# Altium integrated library Audio_Research.IntLib: 75 symbols (continued)
## ERJ-3EKF4991V (continued)
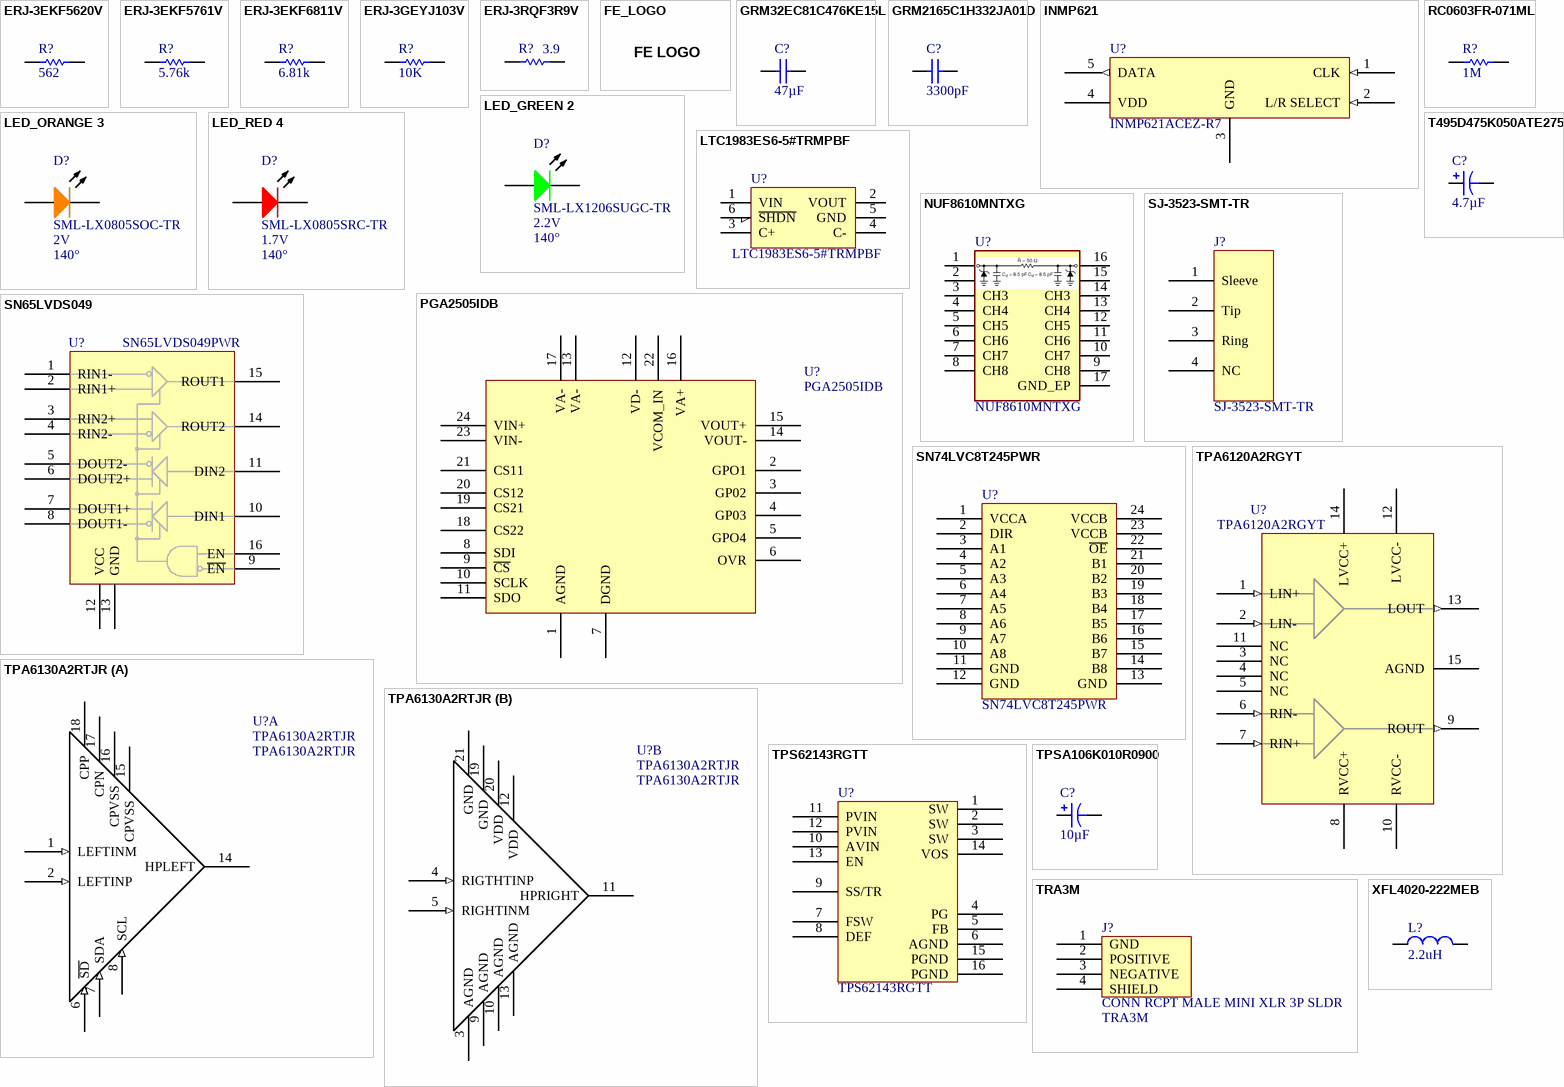
[diagram p2: symbols ERJ-3EKF5620V to XFL4020-222MEB]

## ERJ-3EKF5620V
designator R?  Resistance (Ohms): 562  (hidden comment: ERJ-3EKF5620V)
RES SMD 562 OHM 1% 1/10W 0603; Manufacturer: Panasonic Electronic Components; Power (Watts): 0.1W, 1/10W; Temperature Coefficient: ±100ppm/°C; Supplier 1: Digi-Key; Manufacturer Part Number: ERJ-3EKF5620V; RoHS: RoHS Compliant; Category: Resistors; Stock 1: 336376; Pricing 1: 1=0.1, 50=0.0114, 100=0.0084, 250=0.00644, 500=0.00514, 1000=0.00379 (USD); Packaging: Cut Tape (CT); Part Status: Active; Tolerance: ±1%; Composition: Thick Film; Features: Automotive AEC-Q200; Operating Temperature: -55°C ~ 155°C; Package / Case: 0603 (1608 Metric); Supplier Device Package: 0603; Size / Dimension: 0.063" L x 0.031" W (1.60mm x 0.80mm); Height: 0.022" (0.55mm); Number of Terminations: 2; Failure Rate: -; ComponentLink1URL: http://industrial.panasonic.com/www-cgi/jvcr13pz.cgi?E+PZ+3+AOA0002+ERJ3EKF5620V+7+WW; ComponentLink1Description: http://industrial.panasonic.com/www-cgi/jvcr13pz.cgi?E+PZ+3+AOA0002+ERJ3EKF5620V+7+WW; Supplier Part Number 1: P562HCT-ND
footprint 3-0603_R_L (Chip Resistor, Body 1.6x0.8mm, IPC High Density)
pins: 1, 2

## ERJ-3EKF5761V
designator R?  Resistance (Ohms): 5.76k  (hidden comment: ERJ-3EKF5761V)
RES SMD 5.76K OHM 1% 1/10W 0603; Manufacturer: Panasonic Electronic Components; Power (Watts): 0.1W, 1/10W; Temperature Coefficient: ±100ppm/°C; Supplier 1: Digi-Key; Manufacturer Part Number: ERJ-3EKF5761V; RoHS: RoHS Compliant; Category: Resistors; Stock 1: 90842; Pricing 1: 1=0.1, 50=0.0114, 100=0.0084, 250=0.00644, 500=0.00514, 1000=0.00379 (USD); Packaging: Cut Tape (CT); Part Status: Active; Tolerance: ±1%; Composition: Thick Film; Features: Automotive AEC-Q200; Operating Temperature: -55°C ~ 155°C; Package / Case: 0603 (1608 Metric); Supplier Device Package: 0603; Size / Dimension: 0.063" L x 0.031" W (1.60mm x 0.80mm); Height: 0.022" (0.55mm); Number of Terminations: 2; ComponentLink1URL: http://industrial.panasonic.com/www-cgi/jvcr13pz.cgi?E+PZ+3+AOA0002+ERJ3EKF5761V+7+WW; ComponentLink1Description: http://industrial.panasonic.com/www-cgi/jvcr13pz.cgi?E+PZ+3+AOA0002+ERJ3EKF5761V+7+WW; Supplier Part Number 1: P5.76KHCT-ND; Load Status: *
footprint 3-0603_R_L (Chip Resistor, Body 1.6x0.8mm, IPC High Density)
pins: 1, 2

## ERJ-3EKF6811V
designator R?  Resistance: 6.81k  (hidden comment: ERJ-3EKF6811V)
RES SMD 6.81K OHM 1% 1/10W 0603; Manufacturer: Panasonic ECG; Voltage Rating: 75V; Power Rating: 100mW; Temperature Coefficient: 100ppm/°C; Voltage Rating (DC): 50V; Stock 1: 326226; Pricing 1: 1=0.1, 10=0.063, 100=0.0257, 1000=0.0115, 2500=0.01 (USD); Mount: Surface Mount; Case/Package: 0603; Case Code (Imperial): 0603; Case Code (Metric): 1608; Contact Plating: Tin; Min Operating Temperature: -55°C; Max Operating Temperature: 155°C; Tolerance: 1%; Packaging: Tape and Reel; Package Quantity: 1; Composition: Thick Film; Number of Terminations: 2; Termination: SMD/SMT; Military Standard: Not; Max Power Dissipation: 100mW; Length: 1.6mm; Height: 0.45mm; Width: 0.8mm; Depth: 0.8mm; Radiation Hardening: No; REACH SVHC: Unknown; Lead Free: Lead Free; ComponentLink1URL: https://datasheet.ciiva.com/9117/aoa0000ce2-9117125.pdf; ComponentLink1Description: https://datasheet.ciiva.com/9117/aoa0000ce2-9117125.pdf; ComponentLink2URL: https://datasheet.ciiva.com/46389/426256-46389990.pdf; ComponentLink2Description: https://datasheet.ciiva.com/46389/426256-46389990.pdf; ComponentLink3URL: https://datasheet.ciiva.com/24027/aoa0000ce2-24027336.pdf; ComponentLink3Description: https://datasheet.ciiva.com/24027/aoa0000ce2-24027336.pdf; ComponentLink4URL: https://datasheet.ciiva.com/28693/1678782-28693560.pdf; ComponentLink4Description: https://datasheet.ciiva.com/28693/1678782-28693560.pdf; ComponentLink5URL: https://datasheet.ciiva.com/5969/426256-5969386.pdf; ComponentLink5Description: https://datasheet.ciiva.com/5969/426256-5969386.pdf; ComponentLink6URL: https://datasheet.ciiva.com/16440/aoa0000ce2-16440170.pdf; ComponentLink6Description: https://datasheet.ciiva.com/16440/aoa0000ce2-16440170.pdf; ComponentLink7URL: https://datasheet.ciiva.com/48531/aoa0000ce2-48531934.pdf; ComponentLink7Description: https://datasheet.ciiva.com/48531/aoa0000ce2-48531934.pdf; ComponentLink8URL: https://datasheet.ciiva.com/16759/70260748-16759487.pdf; ComponentLink8Description: https://datasheet.ciiva.com/16759/70260748-16759487.pdf; ComponentLink9URL: https://datasheet.ciiva.com/43460/426256-43460527.pdf; ComponentLink9Description: https://datasheet.ciiva.com/43460/426256-43460527.pdf; Supplier Part Number 1: P6.81KHDKR-ND; Supplier 1: Digi-Key; Manufacturer Part Number: ERJ-3EKF6811V
footprint 3-0603_R_L (Chip Resistor, Body 1.6x0.8mm, IPC High Density)
pins: 1, 2

## ERJ-3GEYJ103V
designator R?  Resistance (Ohms): 10K  (hidden comment: ERJ-3GEYJ103V)
RES 10K OHM 1/10W 5% 0603 SMD; Manufacturer: Panasonic - ECG; Power (Watts): 0.1W, 1/10W; Temperature Coefficient: ±200ppm/°C; Supplier 1: Digi-Key; Manufacturer Part Number: ERJ-3GEYJ103V; RoHS: RoHS Compliant; Category: Resistors; Stock 1: 16219504; Pricing 1: 1=0.02, 50=0.0092, 100=0.007, 250=0.0052, 500=0.00384, 1000=0.00256 (USD); Composition: Thick Film; Features: -; Tolerance: ±5%; Package / Case: 0603 (1608 Metric); Size / Dimension: 0.063" L x 0.031" W (1.60mm x 0.80mm); Height: 0.022" (0.55mm); Number of Terminations: 2; Packaging: Cut Tape (CT); ComponentLink1URL: http://industrial.panasonic.com/www-cgi/jvcr13pz.cgi?E+PZ+3+AOA0001+ERJ3GEYJ103V+7+WW; ComponentLink1Description: http://industrial.panasonic.com/www-cgi/jvcr13pz.cgi?E+PZ+3+AOA0001+ERJ3GEYJ103V+7+WW; Supplier Part Number 1: P10KGCT-ND
footprint 3-0603_R_L (Chip Resistor, Body 1.6x0.8mm, IPC High Density)
pins: 1, 2

## ERJ-3RQF3R9V
designator R?  Resistance (Ohms): 3.9  (hidden comment: ERJ-3RQF3R9V)
RES 3.9 OHM 1/10W 1% 0603 SMD; Manufacturer: Panasonic Electronic Components; Power (Watts): 0.1W, 1/10W; Temperature Coefficient: ±200ppm/°C; Supplier 1: Digi-Key; Manufacturer Part Number: ERJ-3RQF3R9V; RoHS: RoHS Compliant; Category: Resistors; Stock 1: 44573; Pricing 1: 1=0.29, 50=0.1138, 100=0.0878, 250=0.06824, 500=0.0481, 1000=0.0351 (USD); Packaging: Cut Tape (CT); Tolerance: ±1%; Composition: Thick Film; Features: -; Package / Case: 0603 (1608 Metric); Supplier Device Package: 0603; Size / Dimension: 0.063" L x 0.031" W (1.60mm x 0.80mm); Height: 0.022" (0.55mm); Number of Terminations: 2; ComponentLink1URL: http://industrial.panasonic.com/www-cgi/jvcr13pz.cgi?E+PZ+3+AOA0003+ERJ3RQF3R9V+7+WW; ComponentLink1Description: http://industrial.panasonic.com/www-cgi/jvcr13pz.cgi?E+PZ+3+AOA0003+ERJ3RQF3R9V+7+WW; Supplier Part Number 1: P3.9AJCT-ND
footprint 3-0603_R_L (Chip Resistor, Body 1.6x0.8mm, IPC High Density)
pins: 1, 2

## FE_LOGO
designator Logo?  (value not drawn)  (no BOM)
FE LOGO in Copper; Load Status: Do Not Install
footprint feLogo_small (FlatEarth small logo in copper)
footprint feLogo_medium (FlatEarth medium logo in copper)
text: FE LOGO

## GRM32EC81C476KE15L
designator C?  Capacitance: 47µF  (hidden comment: GRM32EC81C476KE15L)
47µF ±10% 16V Ceramic Capacitor X6S 1210 (3225 Metric); Manufacturer: Murata Electronics North America; Supplier 1: Digi-Key; Manufacturer Part Number: GRM32EC81C476KE15L; RoHS: RoHS Compliant; Category: Capacitors; Stock 1: 39641; Pricing 1: 1=0.73, 10=0.697, 25=0.4944, 50=0.4164, 100=0.3383, 250=0.28108, 500=0.25504 (USD); Packaging: Cut Tape (CT); Tolerance: ±10%; Voltage - Rated: 16V; Temperature Coefficient: X6S; Mounting Type: Surface Mount, MLCC; Operating Temperature: -55°C ~ 105°C; Applications: General Purpose; Ratings: -; Package / Case: 1210 (3225 Metric); Size / Dimension: 0.126" L x 0.098" W (3.20mm x 2.50mm); Height - Seated (Max): -; Thickness (Max): 0.106" (2.70mm); Lead Spacing: -; Features: Derating Recommended; Lead Style: -; ComponentLink1URL: http://www.murata.com/~/media/webrenewal/support/library/catalog/products/capacitor/mlcc/c02e.pdf; ComponentLink1Description: http://www.murata.com/~/media/webrenewal/support/library/catalog/products/capacitor/mlcc/c02e.pdf; Supplier Part Number 1: 490-10531-1-ND; Part Status: Active; Failure Rate: *
footprint C1210X25_L (Chip Capacitor, Body 3.2x2.5mm, IPC High Density)
pins: 1, 2

## GRM2165C1H332JA01D
designator C?  Capacitance: 3300pF  (hidden comment: GRM2165C1H332JA01D)
CAP CER 3300PF 50V NP0 0805; Manufacturer: Murata Electronics North America; Tolerance: ±5%; Temperature Coefficient: C0G, NP0; Supplier 1: Digi-Key; Manufacturer Part Number: GRM2165C1H332JA01D; RoHS: RoHS Compliant; Category: Capacitors; Stock 1: 67484; Pricing 1: 1=0.17, 10=0.12, 50=0.069, 100=0.057, 250=0.048, 500=0.0402, 1000=0.033 (USD); Packaging: Cut Tape (CT); Part Status: Active; Voltage - Rated: 50V; Operating Temperature: -55°C ~ 125°C; Ratings: -; Applications: General Purpose; Mounting Type: Surface Mount, MLCC; Package / Case: 0805 (2012 Metric); Size / Dimension: 0.079" L x 0.049" W (2.00mm x 1.25mm); Thickness (Max): 0.028" (0.70mm); ComponentLink1URL: http://www.murata.com/~/media/webrenewal/support/library/catalog/products/capacitor/mlcc/c02e.pdf; ComponentLink1Description: http://www.murata.com/~/media/webrenewal/support/library/catalog/products/capacitor/mlcc/c02e.pdf; Supplier Part Number 1: 490-1632-1-ND
footprint 6-0805_L (Chip Capacitor, Body 2.0x1.2mm, IPC High Density)
pins: 1, 2

## INMP621
designator U?  Manufacturer Part Number: INMP621ACEZ-R7  (hidden comment: INMP621)
45Hz ~ 20kHz Digital, PDM Microphone MEMS (Silicon) Omnidirectional (-46dB ±2dB @ 94dB SPL) Solder Pads; Manufacturer: InvenSense; S/N Ratio: 65dB; Voltage Range: 1.62 ~ 3.63V; Current - Supply: 1.6mA; Port Location: Bottom; Seal Rating: None; Shape: Rectangular; Supplier 1: Digi-Key; RoHS: RoHS Compliant; Category: Audio Products; Stock 1: 1211; Pricing 1: 1=2.88, 10=2.491, 25=2.2292, 50=1.9668, 100=1.9012, 250=1.83568, 500=1.77012 (USD); Packaging: Cut Tape (CT); Part Status: Active; Type: MEMS (Silicon); Output Type: Digital, PDM; Direction: Omnidirectional; Frequency Range: 45Hz ~ 20kHz; Sensitivity: -46dB ±2dB @ 94dB SPL; Impedance: -; Voltage - Rated: -; Termination: Solder Pads; Size / Dimension: 4.00mm L x 3.00mm W; Height (Max): 1.10mm; ComponentLink1URL: https://www.invensense.com/wp-content/uploads/2015/02/INMP621.pdf; ComponentLink1Description: https://www.invensense.com/wp-content/uploads/2015/02/INMP621.pdf; Supplier Part Number 1: 1428-1018-1-ND
footprint INMP621 (Wide Dynamic Range Microphone with PDM Digital Output)
pins: 1 CLK (in) "Clock Input to Microphone", 2 L/R SELECT (in) "Left Channel or Right Channel Select:  DATA 1 (right): L/R SELECT tied to GND  DATA 2 (left): L/R SELECT tied to VDD", 3 GND "Ground", 4 VDD "Power Supply. For best performance and to avoid potential parasitic artifacts, place a 0.1 µF (100 nF) ceramic type X7R capacitor between Pin 4 (VDD) and ground. Place the capacitor as close to Pin 4 as possible.", 5 DATA (out) "Digital Output Signal (DATA1 or DATA2)"

## LED_GREEN 2
designator D?  Manufacturer Part Number: SML-LX1206SUGC-TR  Voltage - Forward (Vf) Typ: 2.2V  Viewing Angle: 140°  (hidden comment: LED_GREEN 2)
LED ALINGAP ULT GRN CLR 1206 SMD; Manufacturer: Lumex Opto/Components Inc; Color: Green; Millicandela Rating: 45mcd; Current - Test: 20mA; Wavelength - Peak: 574nm; Lens Type: Clear; Lens Style/Size: Rectangle with Flat Top, 2mm x 1.6mm; Supplier 1: Digi-Key; RoHS: RoHS Compliant; Category: Optoelectronics; Stock 1: 11785; Pricing 1: 1=0.64, 10=0.49, 100=0.3534, 250=0.31352, 500=0.2679, 1000=0.2109 (USD); Wavelength - Dominant: -; Package / Case: 1206 (3216 Metric); Size / Dimension: 3.20mm L x 1.60mm W; Height: 1.10mm; Mounting Type: Surface Mount; Packaging: Cut Tape (CT); Luminous Flux @ Current - Test: -; ComponentLink1URL: http://www.lumex.com/specs/SML-LX1206SUGC-TR.pdf; ComponentLink1Description: http://www.lumex.com/specs/SML-LX1206SUGC-TR.pdf; Supplier Part Number 1: 67-1698-1-ND
footprint DIOCP3216X11L (Chip Diode, 2-Leads, Body 3.2x1.6mm, IPC High Density)
pins: 1 A, 2 K

## LED_ORANGE 3
designator D?  Manufacturer Part Number: SML-LX0805SOC-TR  Voltage - Forward (Vf) (Typ): 2V  Viewing Angle: 140°  (hidden comment: LED_ORANGE 3)
LED 610NM SUPER ORANGE 0805 SMD; Manufacturer: Lumex Opto/Components Inc; Millicandela Rating: 60mcd; Current - Test: 20mA; Lens Type: Clear; Lens Style/Size: Rectangle with Flat Top, 1.4mm x 1.25mm; Supplier 1: Digi-Key; RoHS: RoHS Compliant; Category: Optoelectronics; Stock 1: 13373; Pricing 1: 1=0.65, 10=0.502, 100=0.3255, 250=0.279, 500=0.2418, 1000=0.186 (USD); Packaging: Cut Tape (CT); Color: Orange; Wavelength - Dominant: -; Wavelength - Peak: 610nm; Package / Case: 0805 (2012 Metric); Size / Dimension: 2.00mm L x 1.25mm W; Height: 1.10mm; Mounting Type: Surface Mount; Luminous Flux @ Current - Test: -; ComponentLink1URL: http://www.lumex.com/specs/SML-LX0805SOC-TR.pdf; ComponentLink1Description: http://www.lumex.com/specs/SML-LX0805SOC-TR.pdf; Supplier Part Number 1: 67-1637-1-ND
footprint DIOM2012X12L_ORANGE (Molded Diode, 2-Leads, Body 2.0x1.3mm, IPC High Density)
pins: 1 A, 2 K

## LED_RED 4
designator D?  Manufacturer Part Number: SML-LX0805SRC-TR  Voltage - Forward (Vf) (Typ): 1.7V  Viewing Angle: 140°  (hidden comment: LED_RED 4)
LED 660NM SUPER RED CLR 0805 T/R; Manufacturer: Lumex Opto/Components Inc; Millicandela Rating: 25mcd; Current - Test: 20mA; Lens Type: Clear; Supplier 1: Digi-Key; RoHS: RoHS Compliant; Category: Optoelectronics; Stock 1: 1141; Pricing 1: 1=0.56, 10=0.395, 100=0.2596, 250=0.19472, 500=0.177, 1000=0.1416 (USD); Packaging: Cut Tape (CT); Color: Red; Wavelength - Dominant: -; Wavelength - Peak: 660nm; Lens Style/Size: *; Package / Case: 0805 (2012 Metric); Size / Dimension: 2.00mm L x 1.25mm W; Height: 1.10mm; Mounting Type: Surface Mount; Luminous Flux @ Current - Test: -; ComponentLink1URL: http://www.lumex.com/specs/SML-LX0805SRC-TR.pdf; ComponentLink1Description: http://www.lumex.com/specs/SML-LX0805SRC-TR.pdf; Supplier Part Number 1: 67-2191-1-ND
footprint DIOM2012X12L_RED (Molded Diode, 2-Leads, Body 2.0x1.3mm, IPC High Density)
pins: 1 A, 2 K

## LTC1983ES6-5#TRMPBF
designator U?  Manufacturer Part Number: LTC1983ES6-5#TRMPBF
IC REG SWITCHD CAP INV -5V SOT23; Manufacturer: Linear Technology; Output Type: Fixed; Number of Outputs: 1; Voltage - Input: 2.3 V ~ 5.5 V; PWM Type: Burst Mode®; Frequency - Switching: 900kHz; Current - Output: 100mA; Synchronous Rectifier: No; Supplier 1: Digi-Key; RoHS: RoHS Compliant; Category: Integrated Circuits (ICs); Stock 1: 6466; Pricing 1: 1=4.28, 25=3.8192, 100=3.4371 (USD); Packaging: Cut Tape (CT); Type: Switched Capacitor (Charge Pump), Inverting; Voltage - Output: -5V; Operating Temperature: -40°C ~ 85°C; Mounting Type: Surface Mount; Package / Case: SOT-23-6 Thin, TSOT-23-6; Supplier Device Package: TSOT-23-6; ComponentLink1URL: http://www.linear.com/docs/2135; ComponentLink1Description: http://www.linear.com/docs/2135; Supplier Part Number 1: LTC1983ES6-5#TRMPBFCT-ND
footprint SOT23-6_L (SOT23, 6-Leads, Body 2.9x1.6mm, Pitch 0.95mm, Lead Span 2.7mm, IPC High Density)
pins: 1 VIN (power), 2 VOUT (power), 3 C+, 4 C-, 5 GND, 6 ~{SHDN}

## NUF8610MNTXG
designator U?
IC EMI FILTER 8CH 16-DFN; Manufacturer: ON Semiconductor; Number of Channels: 8; Attenuation Value: 15dB; ESD Protection: Yes; Capacitance: 8.5pF; Operating Supply Voltage: 5V; Number of Elements: 16; DC Resistance (DCR): 58R; Supplier 1: Digi-Key; Stock 1: 3186; Pricing 1: 1=0.47, 10=0.441, 25=0.4204, 50=0.4068, 100=0.3933, 250=0.373, 500=0.31194, 1000=0.2421 (USD); Packaging: Tape and Reel; Height: 0.039inch; ComponentLink1URL: https://datasheet.ciiva.com/1022/nuf8610-d-1022805.pdf; ComponentLink1Description: https://datasheet.ciiva.com/1022/nuf8610-d-1022805.pdf; Supplier Part Number 1: NUF8610MNTXGOSCT-ND; Manufacturer Part Number: NUF8610MNTXG; Case/Package: DFN; Number of Pins: 16; Contact Plating: Tin,Matte; Min Operating Temperature: -40°C; Max Operating Temperature: 85°C; Package Quantity: 4000; Termination: Flat; Length: 4mm; Width: 0.063inch; Depth: 1.6mm; Radiation Hardening: No; REACH SVHC: No SVHC; Lead Free: Lead Free; ComponentLink2URL: https://datasheet.ciiva.com/1022/nuf8610-d-1022806.pdf; ComponentLink2Description: https://datasheet.ciiva.com/1022/nuf8610-d-1022806.pdf; ComponentLink3URL: https://datasheet.ciiva.com/1022/nuf8610-d-1022807.pdf; ComponentLink3Description: https://datasheet.ciiva.com/1022/nuf8610-d-1022807.pdf; ComponentLink4URL: https://datasheet.ciiva.com/26019/nuf8610-d-26019159.pdf; ComponentLink4Description: https://datasheet.ciiva.com/26019/nuf8610-d-26019159.pdf; ComponentLink5URL: https://datasheet.ciiva.com/12395/nuf8610-d-116660-12395000.pdf; ComponentLink5Description: https://datasheet.ciiva.com/12395/nuf8610-d-116660-12395000.pdf; Voltage Rating (DC): 5V; Circuit Type: Filter; Number of Lines: 8; Halogen Free: Halogen Free
footprint ONSC-DFN-16-506AC_V (SON, 16-Leads, Body 4x1.6mm, Pitch 0.5mm, Thermal Pad 4.1x0.5mm)
pins: 1 CH1, 2 CH2, 3 CH3, 4 CH4, 5 CH5, 6 CH6, 7 CH7, 8 CH8, 9 CH8, 10 CH7, 11 CH6, 12 CH5, 13 CH4, 14 CH3, 15 CH2, 16 CH1, 17 GND_EP (power)

## PGA2505IDB
designator U?, comment Manufacturer Part Number: PGA2505IDB  (hidden comment: Microphone Preamp)
IC DGTL CTRLR MICOPHN AMP 24SSOP; Manufacturer: Texas Instruments; Number of Channels: 1; Max Supply Voltage: 5.25V; Min Supply Voltage: 4.75V; Operating Supply Current: 30mA; Input Offset Voltage (Vos): 1mV; Gain: 60dB; Interface: SPI; Dual Supply Voltage: 5V; Input Voltage Noise Density: 3nV/sqrt Hz; Min Dual Supply Voltage: -4.75V; Load Impedance: 600R; Supplier 1: Digi-Key; Stock 1: 358; Pricing 1: 1=10.98, 10=10.088, 100=8.52, 500=7.5792, 1000=6.9519 (USD); Case/Package: SSOP; Number of Pins: 24; Weight: 0.007764oz; Min Operating Temperature: -40°C; Max Operating Temperature: 85°C; Packaging: Rail/Tube; Package Quantity: 60; Max Input Voltage: 5.25V; Quiescent Current: 30mA; Max Dual Supply Voltage: 5.25V; Operating Supply Voltage: 5V; Length: 8.2mm; Height: 1.95mm; Width: 5.3mm; Radiation Hardening: No; REACH SVHC: No SVHC; Lead Free: Lead Free; ComponentLink1URL: https://datasheet.ciiva.com/1789/pga2505-1789587.pdf; ComponentLink1Description: https://datasheet.ciiva.com/1789/pga2505-1789587.pdf; ComponentLink2URL: https://datasheet.ciiva.com/2968/pga2505-2968036.pdf; ComponentLink2Description: https://datasheet.ciiva.com/2968/pga2505-2968036.pdf; ComponentLink3URL: https://datasheet.ciiva.com/15131/getdatasheetpartid-220694-15131828.pdf; ComponentLink3Description: https://datasheet.ciiva.com/15131/getdatasheetpartid-220694-15131828.pdf; ComponentLink4URL: https://datasheet.ciiva.com/26118/sbos396b-26118602.pdf; ComponentLink4Description: https://datasheet.ciiva.com/26118/sbos396b-26118602.pdf; ComponentLink5URL: https://datasheet.ciiva.com/1481/1772560-1481451.pdf; ComponentLink5Description: https://datasheet.ciiva.com/1481/1772560-1481451.pdf; ComponentLink6URL: https://datasheet.ciiva.com/26842/pga2505idb-26842003.pdf; ComponentLink6Description: https://datasheet.ciiva.com/26842/pga2505idb-26842003.pdf; Supplier Part Number 1: 296-24572-5-ND
footprint SOP65P780X200-28N (SOP, 28-Leads, Body 10.20x5.30mm, Pitch 0.65mm, IPC Medium Density)
pins: 1 AGND, 2 GPO1, 3 GP02, 4 GP03, 5 GPO4, 6 OVR, 7 DGND, 8 SDI, 9 ~{CS}, 10 SCLK, 11 SDO, 12 VD-, 13 VA-, 14 VOUT-, 15 VOUT+, 16 VA+, 17 VA-, 18 CS22, 19 CS21, 20 CS12, 21 CS11, 22 VCOM_IN, 23 VIN-, 24 VIN+

## RC0603FR-071ML
designator R?  Resistance: 1M  (hidden comment: RC0603FR-071ML)
RES SMD 1M OHM 1% 1/10W 0603; Manufacturer: Yageo; Voltage Rating: 50V; Power Rating: 100mW; Temperature Coefficient: 100ppm/°C; Supplier 1: Digi-Key; Manufacturer Part Number: RC0603FR-071ML; Stock 1: 1662972; Pricing 1: 1=0.1, 10=0.015, 100=0.006, 1000=0.0027, 2500=0.0023 (USD); Case/Package: 0603; Number of Pins: 2; Case Code (Imperial): 0603; Case Code (Metric): 1608; Min Operating Temperature: -55°C; Max Operating Temperature: 155°C; Voltage Rating (DC): 50V; Tolerance: 1%; Packaging: Tape and Reel; Package Quantity: 5000; Termination: SMD/SMT; Composition: Thick Film; Military Standard: Not; Length: 1.6mm; Height: 0.45mm; Width: 0.8mm; Depth: 0.8mm; REACH SVHC: No SVHC; Lead Free: Lead Free; ComponentLink1URL: https://datasheet.ciiva.com/12555/rc0603-272842-12555388.pdf; ComponentLink1Description: https://datasheet.ciiva.com/12555/rc0603-272842-12555388.pdf; ComponentLink2URL: https://datasheet.ciiva.com/7983/443971-7983614.pdf; ComponentLink2Description: https://datasheet.ciiva.com/7983/443971-7983614.pdf; ComponentLink3URL: https://datasheet.ciiva.com/11819/0900766b80f96399-11819295.pdf; ComponentLink3Description: https://datasheet.ciiva.com/11819/0900766b80f96399-11819295.pdf; Supplier Part Number 1: 311-1.00MHRDKR-ND
footprint 3-0603_R_L (Chip Resistor, Body 1.6x0.8mm, IPC High Density)
pins: 1, 2

## SJ-3523-SMT-TR
designator J?
3.50mm (0.141", 1/8", Mini Plug) - Headphone Phone Jack Stereo Connector Solder; Manufacturer: CUI Inc.; Gender: Female; Actual Diameter: 0.142" (3.60mm); Number of Positions/Contacts: 3 Conductors, 3 Contacts; Internal Switch(s): Does Not Contain Switch; Shielding: Unshielded; Voltage - Rated: 12VDC; Current Rating: 1A; Mating Length/Depth: 0.551" (14.00mm); Body Color: Black; Includes: 1 pc - 1 Connector; LatestRevisionDate: 17-Jul-2002; LatestRevisionNote: Re-released for DXP Platform.; Publisher: Altium Limited; Supplier 1: Digi-Key; RoHS: RoHS Compliant; Category: Connectors, Interconnects; Stock 1: 104981; Pricing 1: 1=1.34, 10=1.043, 100=0.7961, 500=0.63558 (USD); Packaging: Cut Tape (CT); Part Status: Active; Connector Type: Phone Jack; Signal Lines: Stereo; Industry Recognized Mating Diameter: 3.50mm (0.141", 1/8", Mini Plug) - Headphone; Mounting Type: Surface Mount, Right Angle; Termination: Solder; Features: Board Guide; Insulation Color: -; Contact Material - Plating: Silver; Body Material: -; ComponentLink1URL: http://www.cui.com/product/resource/digikeypdf/sj-352x-smt_series.pdf; ComponentLink1Description: http://www.cui.com/product/resource/digikeypdf/sj-352x-smt_series.pdf; Supplier Part Number 1: CP-3523SJCT-ND; Manufacturer Part Number: SJ-3523-SMT-TR
footprint SJ-3523-SMT-TR (Female 3.5mm audio jack)
pins: 1 Sleeve, 2 Tip, 3 Ring, 4 NC

## SN65LVDS049
designator U?, comment Manufacturer Part Number: SN65LVDS049PWR  (hidden comment: IC LVDS DUAL DIF DVR/RCV 16TSSOP)
2/2 Transceiver Full LVDS 16-TSSOP; Manufacturer: Texas Instruments; Max Power Dissipation: 774mW; Nominal Supply Current: 35mA; Propagation Delay: 3.5ns; Max Supply Voltage: 3.6V; Min Supply Voltage: 3V; Number of Receivers: 2; Operating Supply Voltage: 3.3V; Data Rate: 400Mbps; Logic Function: Transceiver,Receiver; Max Input Current: 20uA; Max Output Voltage: 450mV; Supplier 1: Digi-Key; Stock 1: 4149; Pricing 1: 1=2.54, 10=2.282, 100=1.8341, 500=1.5069, 1000=1.2486 (USD); Case/Package: TSSOP; Number of Pins: 16; Weight: 0.002116oz; Contact Plating: Gold; Min Operating Temperature: -40°C; Max Operating Temperature: 85°C; Packaging: Tape and Reel; Package Quantity: 1; Number of Elements: 2; Number of Drivers: 2; Power Dissipation: 774mW; Turn-On Delay Time: 3.5ns; Radiation Hardening: No; REACH SVHC: No SVHC; Lead Free: Lead Free; ComponentLink1URL: https://datasheet.ciiva.com/1703/sn65lvds049-1703872.pdf; ComponentLink1Description: https://datasheet.ciiva.com/1703/sn65lvds049-1703872.pdf; ComponentLink2URL: https://datasheet.ciiva.com/1703/sn65lvds049-1703873.pdf; ComponentLink2Description: https://datasheet.ciiva.com/1703/sn65lvds049-1703873.pdf; ComponentLink3URL: https://datasheet.ciiva.com/15133/getdatasheetpartid-298932-15133393.pdf; ComponentLink3Description: https://datasheet.ciiva.com/15133/getdatasheetpartid-298932-15133393.pdf; ComponentLink4URL: https://datasheet.ciiva.com/3152/sn65lvds049-3152685.pdf; ComponentLink4Description: https://datasheet.ciiva.com/3152/sn65lvds049-3152685.pdf; ComponentLink5URL: https://datasheet.ciiva.com/26828/sn65lvds049pwr-26828740.pdf; ComponentLink5Description: https://datasheet.ciiva.com/26828/sn65lvds049pwr-26828740.pdf; Supplier Part Number 1: 296-26358-6-ND
footprint TSOP65P640X120-16N (TSOP, 16-Leads, Body 5.00x4.40mm, Pitch 0.65mm, IPC Medium Density)
pins: 1 RIN1-, 2 RIN1+, 3 RIN2+, 4 RIN2-, 5 DOUT2-, 6 DOUT2+, 7 DOUT1+, 8 DOUT1-, 9 ~{EN}, 10 DIN1, 11 DIN2, 12 VCC (power), 13 GND (power), 14 ROUT2, 15 ROUT1, 16 EN

## SN74LVC8T245PWR
designator U?, comment Manufacturer Part Number: SN74LVC8T245PWR  (hidden comment: IC BUS TRANSCVR 8BIT 24TSSOP)
Voltage Level Translator Bidirectional 1 Circuit 8 Channel 24-TSSOP; Manufacturer: Texas Instruments; Number of Channels: 8; Propagation Delay: 4.2ns; Number of Elements: 1; Min Supply Voltage: 1.65V; Max Supply Voltage: 5.5V; Operating Supply Voltage: 3.3V; Data Rate: 500Mbps; Logic Function: Transceiver,Translator; High Level Output Current: -32mA; Low Level Output Current: 32mA; Polarity: Non-Inverting; Turn-On Delay Time: 32.2ns; Quiescent Current: 15uA; ComponentLink1URL: https://datasheet.ciiva.com/1899/sn74lvc8t245-1899395.pdf; ComponentLink1Description: https://datasheet.ciiva.com/1899/sn74lvc8t245-1899395.pdf; ComponentLink2URL: https://datasheet.ciiva.com/34301/1048559-34301923.pdf; ComponentLink2Description: https://datasheet.ciiva.com/34301/1048559-34301923.pdf; ComponentLink3URL: https://datasheet.ciiva.com/1899/sn74lvc8t245-1899396.pdf; ComponentLink3Description: https://datasheet.ciiva.com/1899/sn74lvc8t245-1899396.pdf; ComponentLink4URL: https://datasheet.ciiva.com/1899/sn74lvc8t245-1899397.pdf; ComponentLink4Description: https://datasheet.ciiva.com/1899/sn74lvc8t245-1899397.pdf; ComponentLink5URL: https://datasheet.ciiva.com/7795/1763937-7795013.pdf; ComponentLink5Description: https://datasheet.ciiva.com/7795/1763937-7795013.pdf; ComponentLink6URL: https://datasheet.ciiva.com/15086/getdatasheetpartid-48801-15086005.pdf; ComponentLink6Description: https://datasheet.ciiva.com/15086/getdatasheetpartid-48801-15086005.pdf; ComponentLink7URL: https://datasheet.ciiva.com/25973/sn74lvc8t245-25973803.pdf; ComponentLink7Description: https://datasheet.ciiva.com/25973/sn74lvc8t245-25973803.pdf; ComponentLink8URL: https://datasheet.ciiva.com/46439/1831204-46439647.pdf; ComponentLink8Description: https://datasheet.ciiva.com/46439/1831204-46439647.pdf; ComponentLink9URL: https://datasheet.ciiva.com/26867/sn74lvc8t245pwr-26867745.pdf; ComponentLink9Description: https://datasheet.ciiva.com/26867/sn74lvc8t245pwr-26867745.pdf; ComponentLink10URL: https://datasheet.ciiva.com/41455/001017232-da-01-en-ic-bus-8bit-sn74lvc8t245pwr-tssop-24-tid-41455868.pdf; ComponentLink10Description: https://datasheet.ciiva.com/41455/001017232-da-01-en-ic-bus-8bit-sn74lvc8t245pwr-tssop-24-tid-41455868.pdf; Supplier 1: Digi-Key; Stock 1: 119243; Pricing 1: 1=1.05, 10=0.936, 100=0.7297, 500=0.6028, 1000=0.4759 (USD); Mount: Surface Mount; Case/Package: TSSOP; Number of Pins: 24; Weight: 0.003157oz; Contact Plating: Gold; Min Operating Temperature: -40°C; Max Operating Temperature: 85°C; Package Quantity: 1; Packaging: Tape and Reel; Direction: Bidirectional; Number of Bits: 8; Number of Outputs: 8; Length: 7.9mm; Height: 1.05mm; Width: 4.5mm; Radiation Hardening: No; REACH SVHC: No SVHC; Lead Free: Lead Free; Supplier Part Number 1: 296-18593-6-ND
footprint TSSOP40P640X120-24N (TSSOP, 24-Leads, Body 5.00x4.40mm, Pitch 0.40mm, IPC Medium Density)
pins: 1 VCCA (power), 2 DIR, 3 A1, 4 A2, 5 A3, 6 A4, 7 A5, 8 A6, 9 A7, 10 A8, 11 GND (power), 12 GND (power), 13 GND (power), 14 B8, 15 B7, 16 B6, 17 B5, 18 B4, 19 B3, 20 B2, 21 B1, 22 ~{OE}, 23 VCCB (power), 24 VCCB (power)

## T495D475K050ATE275
designator C?  Capacitance: 4.7µF  (hidden comment: T495D475K050ATE275)
CAP TANT 4.7UF 50V 10% 2917; Manufacturer: KEMET; Manufacturer Size Code: D; Type: Molded; ESR (Equivalent Series Resistance): 275 mOhm; Lifetime @ Temp.: 2000 Hrs @ 85°C; Supplier 1: Digi-Key; Manufacturer Part Number: T495D475K050ATE275; RoHS: RoHS Compliant; Category: Capacitors; Stock 1: 9255; Pricing 1: 1=2.05, 10=1.656, 25=1.5052, 50=1.445, 100=1.2644, 250=1.0838 (USD); Packaging: Cut Tape (CT); Part Status: Active; Tolerance: ±10%; Voltage - Rated: 50V; Operating Temperature: -55°C ~ 125°C; Mounting Type: Surface Mount; Package / Case: 2917 (7343 Metric); Size / Dimension: 0.287" L x 0.169" W (7.30mm x 4.30mm); Height - Seated (Max): 0.122" (3.10mm); Lead Spacing: -; Features: General Purpose; Failure Rate: -; ComponentLink1URL: http://www.kemet.com/docfinder?Partnumber=T495D475K050ATE275; ComponentLink1Description: http://www.kemet.com/docfinder?Partnumber=T495D475K050ATE275; Supplier Part Number 1: 399-4786-1-ND
footprint 2917-Tantalum-Cap
pins: 1 P, 2 N

## TPA6120A2RGYT
designator U?
Amplifier IC Headphones, 2-Channel (Stereo) Class AB 14-VQFN (3.5x3.5); Manufacturer: Texas Instruments; Max Output Power x Channels @ Load: 80mW x 2 @ 600 Ohm; Voltage - Supply: 10 V ~ 30 V, ±5 V ~ 15 V; LatestRevisionDate: 17-Jul-2002; LatestRevisionNote: Re-released for DXP Platform.; Publisher: Altium Limited; Supplier 1: Digi-Key; RoHS: RoHS Compliant; Category: Integrated Circuits (ICs); Stock 1: 867; Pricing 1: 1=6.04, 10=5.424, 100=4.4501 (USD); Packaging: Cut Tape (CT); Part Status: Active; Type: Class AB; Output Type: Headphones, 2-Channel (Stereo); Features: Differential Inputs, Short-Circuit and Thermal Protection; Mounting Type: Surface Mount; Operating Temperature: -40°C ~ 85°C (TA); Supplier Device Package: 14-VQFN (3.5x3.5); Package / Case: 14-VFQFN Exposed Pad; ComponentLink1URL: http://www.ti.com/lit/ds/symlink/tpa6120a2.pdf; ComponentLink1Description: http://www.ti.com/lit/ds/symlink/tpa6120a2.pdf; Supplier Part Number 1: 296-38029-1-ND; Manufacturer Part Number: TPA6120A2RGYT
footprint PQFN50P350X350X100_HS-15N (PQFN, 14-Leads, Body 3.50x3.50mm, Pitch 1.50mm/0.50mm, Thermal Pad 2.05x2.05mm, IPC Medium Density)
pins: 1 LIN+ (in) "Left channel positive input", 2 LIN- (in) "Left channel negative input", 3 NC, 4 NC, 5 NC, 6 RIN- (in) "Right channel negative input", 7 RIN+ (in) "Right channel positive input", 8 RVCC+ "Right channel positive power supply - must be kept at the same potential as LVCC+ if both amplifiers are to be used.", 9 ROUT (out) "Right channel output", 10 RVCC- "Right channel negative power supply - must be kept at the same potential as LVCC- if both amplifiers are to be used.", 11 NC, 12 LVCC- "Left channel negative power supply – must be kept at the same potential as RVCC- if both amplifiers are to be used.", 13 LOUT (out) "Left channel output", 14 LVCC+ "Left channel positive power supply – must be kept at the same potential as RVCC+ if both amplifiers are to be used.", 15 AGND

## TPA6130A2RTJR
designator U?
Amplifier IC Headphones, 2-Channel (Stereo) Class AB 20-QFN (4x4); Manufacturer: Texas Instruments; Max Output Power x Channels @ Load: 290mW x 1 @ 16 Ohm; 138mW x 2 @ 16 Ohm; Voltage - Supply: 2.5 V ~ 5.5 V; LatestRevisionDate: 17-Jul-2002; LatestRevisionNote: Re-released for DXP Platform.; Publisher: Altium Limited; Supplier 1: Digi-Key; RoHS: RoHS Compliant; Category: Integrated Circuits (ICs); Stock 1: 15763; Pricing 1: 1=2.19, 10=1.966, 100=1.5768, 500=1.296, 1000=0.9 (USD); Packaging: Cut Tape (CT); Part Status: Active; Type: Class AB; Output Type: Headphones, 2-Channel (Stereo); Features: Depop, Differential Inputs, I²C, Mute, Short-Circuit and Thermal Protection, Shutdown, Volume Control; Mounting Type: Surface Mount; Operating Temperature: -40°C ~ 85°C (TA); Supplier Device Package: 20-QFN (4x4); Package / Case: 20-WFQFN Exposed Pad; ComponentLink1URL: http://www.ti.com/lit/ds/symlink/tpa6130a2.pdf; ComponentLink1Description: http://www.ti.com/lit/ds/symlink/tpa6130a2.pdf; Supplier Part Number 1: 296-21656-1-ND; Manufacturer Part Number: TPA6130A2RTJR
footprint QFN50P400X400X80_HS-21N (QFN, 20-Leads, Body 4.00x4.00mm, Pitch 0.50mm, Thermal Pad 2.70x2.70mm, IPC Medium Density)
part A pins: 1 LEFTINM (in) "Left channel negative differential input. Impedance must be matched to LEFTINP. Connect the left input to LEFTINM when using single-ended inputs.", 2 LEFTINP (in) "Left channel positive differential input. Impedance must be matched to LEFTINM. AC ground LEFTINP near signal source while maintaining matched impedance to LEFTINM when using singleended  inputs.", 6 ~{SD} (in) "Shutdown. Active low logic. 5V tolerant input.", 7 SDA (in) "SDA - I2C Data. 5V tolerant input.", 8 SCL (in) "SCL - I2C Clock. 5V tolerant input.", 14 HPLEFT "Headphone left channel output. Connect to left terminal of headphone jack.", 15 CPVSS "Negative supply generated by the charge pump. Decouple to pin 19 on the QFN or a GND plane. Use a 1 μF capacitor", 16 CPVSS "Negative supply generated by the charge pump. Decouple to pin 19 on the QFN or a GND plane. Use a 1 μF capacitor", 17 CPN "Charge pump flying capacitor negative terminal. Connect one side of the flying capacitor to CPN.", 18 CPP "Charge pump flying capacitor negative terminal. Connect one side of the flying capacitor to CPN."
part B pins: 3 AGND, 4 RIGTHTINP (in) "Right channel positive differential input. Impedance must be matched to RIGHTINM. AC ground RIGHTINP near signal source while maintaining matched impedance to RIGHTINM when using  single-ended inputs.", 5 RIGHTINM (in) "Right channel negative differential input. Impedance must be matched to RIGHTINP. Connect the right input to RIGHTINM when using single-ended inputs.", 9 AGND, 10 AGND, 11 HPRIGHT "Headphone light channel output. Connect to the right terminal of the headphone jack.", 12 VDD, 13 AGND, 19 GND, 20 VDD, 21 GND

## TPS62143RGTT
designator U?, comment Manufacturer Part Number: TPS62143RGTT  (hidden comment: IC REG BUCK 5V 2A SYNC 16QFN)
Buck Switching Regulator IC Positive Fixed 5V 1 Output 2A 16-VFQFN Exposed Pad; Manufacturer: Texas Instruments; Switching Frequency: 2.5MHz; Number of Outputs: 1; Max Input Voltage: 17V; Min Input Voltage: 3V; Synchronous Rectifier: Yes; Quiescent Current: 17uA; Supplier 1: Digi-Key; Stock 1: 1958; Pricing 1: 1=2.57, 10=2.306, 100=1.8538 (USD); Case/Package: VQFN; Number of Pins: 16; Min Operating Temperature: -40°C; Max Operating Temperature: 125°C; Output Voltage: 5V; Output Current: 2A; Packaging: Tape and Reel; Package Quantity: 250; Nominal Output Voltage: 5V; Max Output Current: 2A; Min Output Voltage: 5V; Max Output Voltage: 5V; Operating Supply Voltage: 17V; Length: 3.15mm; Height: 0.95mm; Width: 3.15mm; Radiation Hardening: No; REACH SVHC: No SVHC; Lead Free: Lead Free; ComponentLink1URL: https://datasheet.ciiva.com/2026/tps62141-2026276.pdf; ComponentLink1Description: https://datasheet.ciiva.com/2026/tps62141-2026276.pdf; ComponentLink2URL: https://datasheet.ciiva.com/26100/tps62140-26100664.pdf; ComponentLink2Description: https://datasheet.ciiva.com/26100/tps62140-26100664.pdf; ComponentLink3URL: https://datasheet.ciiva.com/28671/1781879-28671384.pdf; ComponentLink3Description: https://datasheet.ciiva.com/28671/1781879-28671384.pdf; ComponentLink4URL: https://datasheet.ciiva.com/2026/tps62140-2026283.pdf; ComponentLink4Description: https://datasheet.ciiva.com/2026/tps62140-2026283.pdf; ComponentLink5URL: https://datasheet.ciiva.com/2026/tps62140-2026284.pdf; ComponentLink5Description: https://datasheet.ciiva.com/2026/tps62140-2026284.pdf; Supplier Part Number 1: 296-29941-6-ND
footprint QFN50P300X300X100_HS-17N (QFN, 16-Leads, Body 3.00x3.00mm, Pitch 0.50mm, Thermal Pad 1.70x1.70mm, IPC Medium Density)
pins: 1 SW, 2 SW, 3 SW, 4 PG, 5 FB, 6 AGND, 7 FSW, 8 DEF, 9 SS/TR, 10 AVIN, 11 PVIN, 12 PVIN, 13 EN, 14 VOS, 15 PGND, 16 PGND

## TPSA106K010R0900
designator C?  Capacitance: 10µF  (hidden comment: TPSA106K010R0900)
CAP TANT 10UF 10V 10% 1206; Manufacturer: AVX Corporation; Manufacturer Size Code: A; ESR (Equivalent Series Resistance): 900 mOhm; Type: Molded; Supplier 1: Digi-Key; Manufacturer Part Number: TPSA106K010R0900; RoHS: RoHS Compliant; Category: Capacitors; Stock 1: 62197; Pricing 1: 1=0.77, 10=0.737, 100=0.3575, 250=0.297, 500=0.2695, 1000=0.2475 (USD); Packaging: Cut Tape (CT); Voltage - Rated: 10V; Tolerance: ±10%; Operating Temperature: -55°C ~ 125°C; Mounting Type: Surface Mount; Package / Case: 1206 (3216 Metric); Size / Dimension: 0.126" L x 0.063" W (3.20mm x 1.60mm); Height - Seated (Max): 0.071" (1.80mm); Lead Spacing: -; Features: General Purpose; Lifetime @ Temp.: -; ComponentLink1URL: http://www.avx.com/docs/Catalogs/tps.pdf; ComponentLink1Description: http://www.avx.com/docs/Catalogs/tps.pdf; Supplier Part Number 1: 478-1751-1-ND
footprint C1206_TANT (Chip Capacitor, Body 3.2x1.6mm, IPC High Density)
pins: 1 P, 2 N

## TRA3M
designator J?, comment CONN RCPT MALE MINI XLR 3P SLDR  Manufacturer Part Number: TRA3M
3 Position Circular Connector Receptacle, Male Pins Solder Silver; Manufacturer: Switchcraft; Body Material: Metal,Copper Alloy; Max Current Rating: 5A; Max Voltage Rating (AC): 125V; Voltage Rating: 250V; Connector Type: Receptacle,Pin; Number of Positions: 3; Number of Ports: 1; Wire/Cable Gauge: 28AWG; Supplier 1: Digi-Key; Stock 1: 295; Pricing 1: 1=12.74, 10=9.754, 25=9.5096, 50=8.7782, 100=8.2906, 250=7.9248 (USD); Mount: Through Hole,Panel,Bulkhead,PCB; Case/Package: Metal; Contact Material: Brass,Copper Alloy; Contact Plating: Nickel,Tin,Silver; Colour: Black; Number of Terminals: 3; Housing Material: Copper Alloy; Insulation Material: Thermoplastic; Min Operating Temperature: -55°C; Max Operating Temperature: 85°C; Package Quantity: 1; Current Rating: 5A; Fastening Type: Threaded; Packaging: Bulk; Gender: Male; Termination: Solder; Number of Contacts: 3; Orientation: Right Angle; Length: 15.49mm; Height: 15.24mm; Depth: 26.92mm; REACH SVHC: No SVHC; Lead Free: Lead Free; ComponentLink1URL: https://datasheet.ciiva.com/7327/tra3m-series-cd-7327368.pdf; ComponentLink1Description: https://datasheet.ciiva.com/7327/tra3m-series-cd-7327368.pdf; ComponentLink2URL: https://datasheet.ciiva.com/16879/70214235-16879259.pdf; ComponentLink2Description: https://datasheet.ciiva.com/16879/70214235-16879259.pdf; ComponentLink3URL: https://datasheet.ciiva.com/8053/28686-8053836.pdf; ComponentLink3Description: https://datasheet.ciiva.com/8053/28686-8053836.pdf; Supplier Part Number 1: SC1550-ND
footprint TRA3M (CONN RCPT MALE MINI XLR 3P SLDR)
pins: 1 GND, 2 POSITIVE, 3 NEGATIVE, 4 SHIELD

## XFL4020-222MEB
designator L?, comment Inductance: 2.2uH  (hidden comment: 2.2uH Ind)
Fixed Inductors XFL4020 AEC-Q200 2.2 uH 20 % 8 A; Manufacturer: Coilcraft; Manufacturer Part Number: XFL4020-222MEB; Core Material: Composite; Tolerance: 20%; Self Resonant Frequency: 38MHz; Shielding: Shielded; Max DC Current: 8A; DC Resistance (DCR): 23.5mR; Test Frequency: 100kHz; Stock 1: 13478; Pricing 1: 1=1.99, 10=1.99, 50=1.99, 100=1.59, 1000=0.885, 10000=0.824 (USD); Min Operating Temperature: -40°C; Max Operating Temperature: 125°C; Packaging: Tape and Reel; Package Quantity: 25; Termination: SMD/SMT; Length: 4.3mm; Height: 2.1mm; Width: 4.3mm; Lead Free: Contains Lead; ComponentLink1URL: http://www.mouser.com/ds/2/597/xfl4020-270756.pdf; ComponentLink1Description: http://www.mouser.com/ds/2/597/xfl4020-270756.pdf; Supplier Part Number 1: 994-XFL4020-222MEB; Supplier 1: Mouser
footprint XFL4020 (Shielded Power Inductors)
pins: 1, 2